# Altium footprint library connectors.PcbLib: 256 footprints (part 10 of 16)
Each footprint in its own frame and in the unit in brackets; x right, y up, seen from the top. Pads: shape width x height; smd on the part's side, far side on the other; paste and mask are expansions set on the pad; w line width, h text height; cw(c..) or ccw(c..) is an arc to the next point about the centre after c.
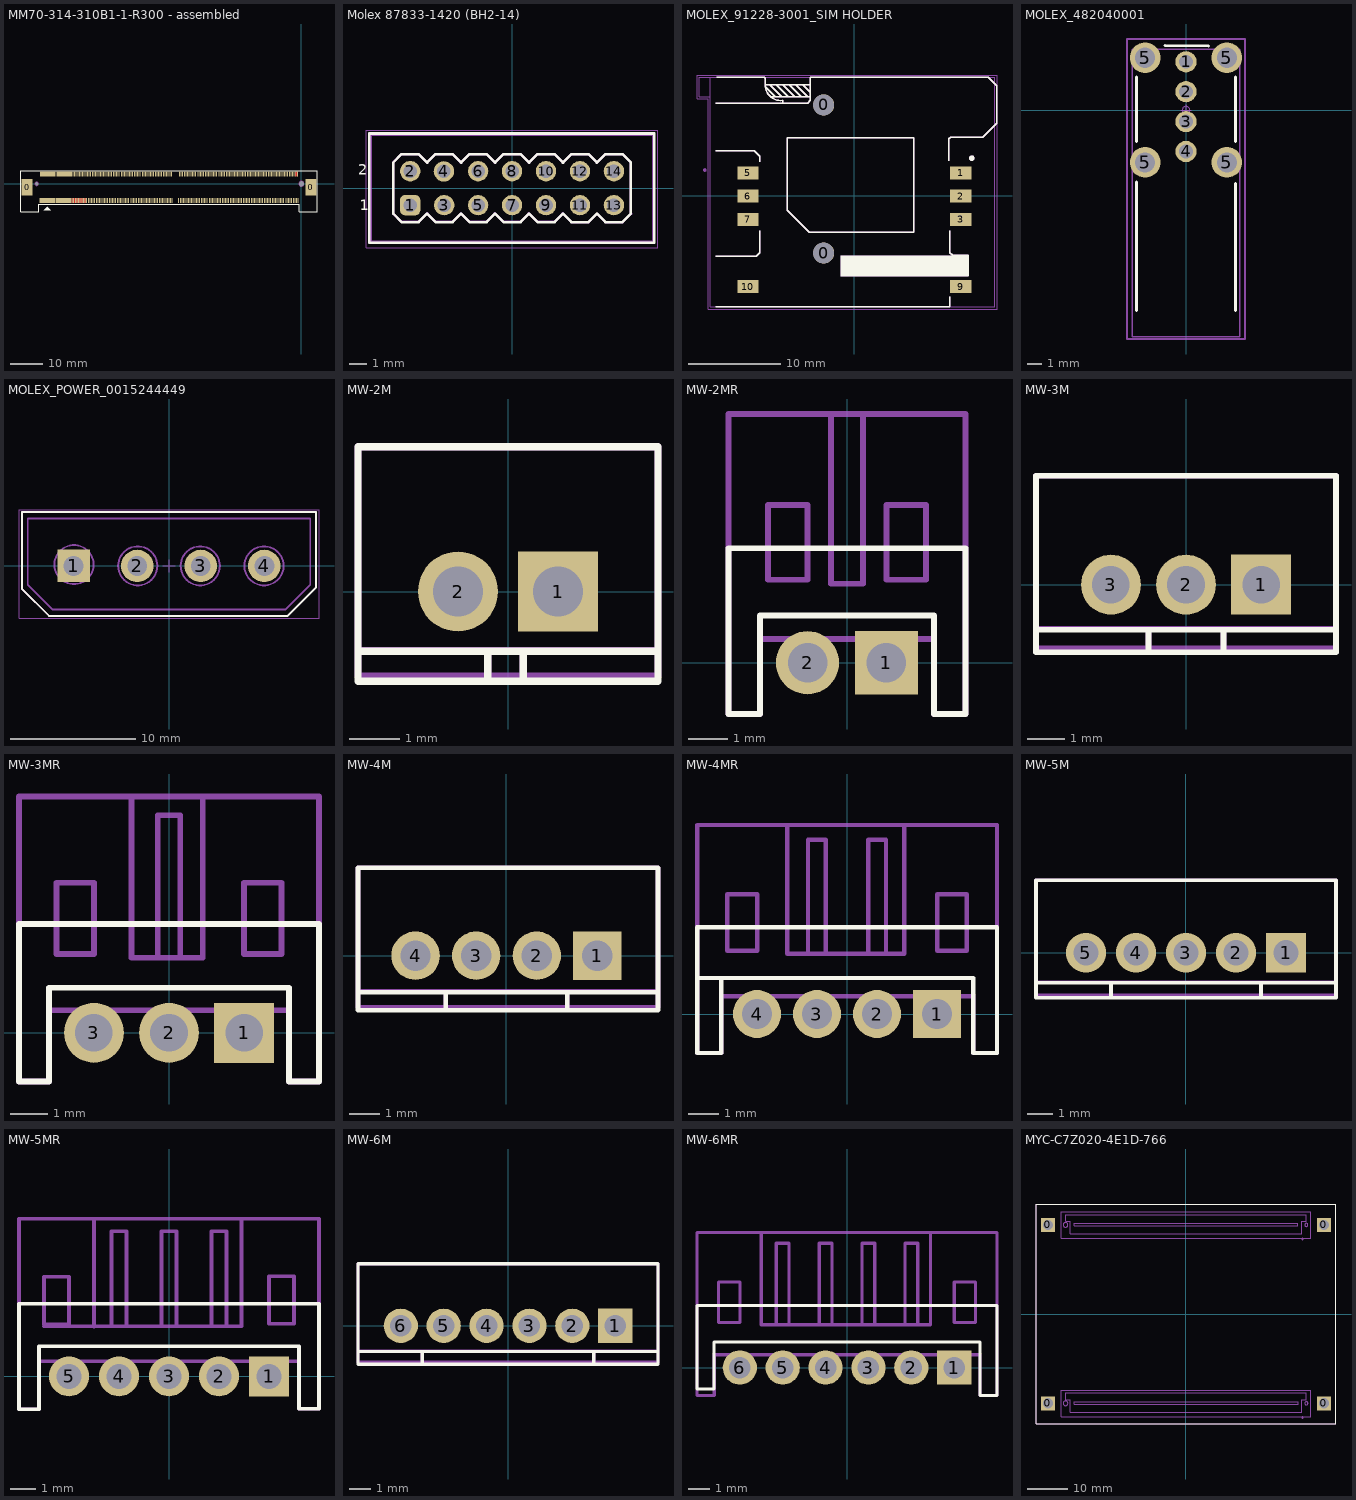
[diagram p9: the footprints below, top view; thin cyan lines are the x and y axes]

## MM70-314-310B1-1-R300 - assembled [mm]
pads (282):
  rect 3.3x5 smd: 0(-84.95,-1.1) 0(2.95,-1.1)
  round 0 hole 1.1 unplated: 0(-82,0)
  round 0 hole 1.6 unplated: 0(0,0)
  rect 0.3x1.5 smd: 1(-71,-5.2) 2(-70.75,3) 3(-70.5,-5.2) 4(-70.25,3) 5(-70,-5.2) 6(-69.75,3) 7(-69.5,-5.2) 8(-69.25,3) 9(-69,-5.2) 10(-68.75,3) 11(-68.5,-5.2) 12(-68.25,3) 13(-68,-5.2) 14(-67.75,3) 15(-67.5,-5.2) 16(-67.25,3) 17(-67,-5.2) 18(-66.75,3) 19(-66.5,-5.2) 20(-66.25,3) 21(-66,-5.2) 22(-65.75,3) 23(-65.5,-5.2) 24(-65.25,3) 25(-65,-5.2) 26(-64.75,3) 27(-64.5,-5.2) 28(-64.25,3) 29(-64,-5.2) 30(-63.75,3) 31(-63.5,-5.2) 32(-63.25,3) 33(-63,-5.2) 34(-62.75,3) 35(-62.5,-5.2) 36(-62.25,3) 37(-62,-5.2) 38(-61.75,3) 39(-61.5,-5.2) 40(-61.25,3) 41(-61,-5.2) 42(-60.75,3) 43(-60.5,-5.2) 44(-60.25,3) 45(-60,-5.2) 46(-59.75,3) 47(-59.5,-5.2) 48(-59.25,3) 49(-59,-5.2) 50(-58.75,3) 51(-58.5,-5.2) 52(-58.25,3) 53(-58,-5.2) 54(-57.75,3) 55(-57.5,-5.2) 56(-57.25,3) 57(-57,-5.2) 58(-56.75,3) 59(-56.5,-5.2) 60(-56.25,3) 61(-56,-5.2) 62(-55.75,3) 63(-55.5,-5.2) 64(-55.25,3) 65(-55,-5.2) 66(-54.75,3) 67(-54.5,-5.2) 68(-54.25,3) 69(-54,-5.2) 70(-53.75,3) 71(-53.5,-5.2) 72(-53.25,3) 73(-53,-5.2) 74(-52.75,3) 75(-52.5,-5.2) 76(-52.25,3) 77(-52,-5.2) 78(-51.75,3) 79(-51.5,-5.2) 80(-51.25,3) 81(-51,-5.2) 82(-50.75,3) 83(-50.5,-5.2) 84(-50.25,3) 85(-50,-5.2) 86(-49.75,3) 87(-49.5,-5.2) 88(-49.25,3) 89(-49,-5.2) 90(-48.75,3) 91(-48.5,-5.2) 92(-48.25,3) 93(-48,-5.2) 94(-47.75,3) 95(-47.5,-5.2) 96(-47.25,3) 97(-47,-5.2) 98(-46.75,3) 99(-46.5,-5.2) 100(-46.25,3) 101(-46,-5.2) 102(-45.75,3) 103(-45.5,-5.2) 104(-45.25,3) 105(-45,-5.2) 106(-44.75,3) 107(-44.5,-5.2) 108(-44.25,3) 109(-44,-5.2) 110(-43.75,3) 111(-43.5,-5.2) 112(-43.25,3) 113(-43,-5.2) 114(-42.75,3) 115(-42.5,-5.2) 116(-42.25,3) 117(-42,-5.2) 118(-41.75,3) 119(-41.5,-5.2) 120(-41.25,3) 121(-41,-5.2) 122(-40.75,3) 123(-40.5,-5.2) 124(-40.25,3) 125(-40,-5.2) 133(-38,-5.2) 134(-37.75,3) 135(-37.5,-5.2) 136(-37.25,3) 137(-37,-5.2) 138(-36.75,3) 139(-36.5,-5.2) 140(-36.25,3) 141(-36,-5.2) 142(-35.75,3) 143(-35.5,-5.2) 144(-35.25,3) 145(-35,-5.2) 146(-34.75,3) 147(-34.5,-5.2) 148(-34.25,3) 149(-34,-5.2) 150(-33.75,3) 151(-33.5,-5.2) 152(-33.25,3) 153(-33,-5.2) 154(-32.75,3) 155(-32.5,-5.2) 156(-32.25,3) 157(-32,-5.2) 158(-31.75,3) 159(-31.5,-5.2) 160(-31.25,3) 161(-31,-5.2) 162(-30.75,3) 163(-30.5,-5.2) 164(-30.25,3) 165(-30,-5.2) 166(-29.75,3) 167(-29.5,-5.2) 168(-29.25,3) 169(-29,-5.2) 170(-28.75,3) 171(-28.5,-5.2) 172(-28.25,3) 173(-28,-5.2) 174(-27.75,3) 175(-27.5,-5.2) 176(-27.25,3) 177(-27,-5.2) 178(-26.75,3) 179(-26.5,-5.2) 180(-26.25,3) 181(-26,-5.2) 182(-25.75,3) 183(-25.5,-5.2) 184(-25.25,3) 185(-25,-5.2) 186(-24.75,3) 187(-24.5,-5.2) 188(-24.25,3) 189(-24,-5.2) 190(-23.75,3) 191(-23.5,-5.2) 192(-23.25,3) 193(-23,-5.2) 194(-22.75,3) 195(-22.5,-5.2) 196(-22.25,3) 197(-22,-5.2) 198(-21.75,3) 199(-21.5,-5.2) 200(-21.25,3) 201(-21,-5.2) 202(-20.75,3) 203(-20.5,-5.2) 204(-20.25,3) 205(-20,-5.2) 206(-19.75,3) 207(-19.5,-5.2) 208(-19.25,3) 209(-19,-5.2) 210(-18.75,3) 211(-18.5,-5.2) 212(-18.25,3) 213(-18,-5.2) 214(-17.75,3) 215(-17.5,-5.2) 216(-17.25,3) 217(-17,-5.2) 218(-16.75,3) 219(-16.5,-5.2) 220(-16.25,3) 221(-16,-5.2) 222(-15.75,3) 223(-15.5,-5.2) 224(-15.25,3) 225(-15,-5.2) 226(-14.75,3) 227(-14.5,-5.2) 228(-14.25,3) 229(-14,-5.2) 230(-13.75,3) 231(-13.5,-5.2) 232(-13.25,3) 233(-13,-5.2) 234(-12.75,3) 235(-12.5,-5.2) 236(-12.25,3) 237(-12,-5.2) 238(-11.75,3) 239(-11.5,-5.2) 240(-11.25,3) 241(-11,-5.2) 242(-10.75,3) 243(-10.5,-5.2) 244(-10.25,3) 245(-10,-5.2) 246(-9.75,3) 247(-9.5,-5.2) 248(-9.25,3) 249(-9,-5.2) 250(-8.75,3) 251(-8.5,-5.2) 252(-8.25,3) 253(-8,-5.2) 254(-7.75,3) 255(-7.5,-5.2) 256(-7.25,3) 257(-7,-5.2) 258(-6.75,3) 259(-6.5,-5.2) 260(-6.25,3) 261(-6,-5.2) 262(-5.75,3) 263(-5.5,-5.2) 264(-5.25,3) 265(-5,-5.2) 266(-4.75,3) 267(-4.5,-5.2) 268(-4.25,3) 269(-4,-5.2) 270(-3.75,3) 271(-3.5,-5.2) 272(-3.25,3) 273(-3,-5.2) 274(-2.75,3) 275(-2.5,-5.2) 276(-2.25,3) 277(-2,-5.2) 278(-1.75,3) 279(-1.5,-5.2) 280(-1.25,3) 281(-1,-5.2)
  rect 4.8x1.5 smd: E1(-78.75,-5.2) E2(-78.5,3) E3(-73.75,-5.2) E4(-73.5,3)
Top Layer:
  region: -71.15,-4.45 -68.85,-4.45 -68.85,-5.95 -71.15,-5.95
  region: -68.65,-4.45 -66.85,-4.45 -66.85,-5.95 -68.65,-5.95
  region: -1.9,3.75 -1.1,3.75 -1.1,2.25 -1.9,2.25
Top Overlay:
  region: -78.7,-7.1 -79.8,-8.2 -77.6,-8.2
  lines w0.15: -86.9,-8.65 -86.9,4 4.9,4 4.9,-8.65 -0.6,-8.65 -0.6,-6.3 -81.4,-6.3 -81.4,-8.65 -86.9,-8.65
Keep-Out Layer:
  circle w0.15: c-82,0 r0.55
  circle w0.15: c0,0 r0.8
3D body "MM70(2).STEP": height 6.8, standoff -0.9, extent -94.65,-166.05 8.35,3.7

## Molex 87833-1420 (BH2-14) [mm] "Molex 87833-1420"
height 6.4
pads (14):
  rrect50% 1.2x1.2 hole 0.8: 1(-6,-1)
  round 1.2 hole 0.8: 2(-6,1) 3(-4,-1) 4(-4.014,0.986) 5(-2,-1) 6(-2,1) 7(0,-1) 8(0,1) 9(2,-1) 10(2,1) 11(4,-1) 12(4,1) 13(6,-1) 14(6,1)
Top Overlay:
  lines w0.15: -7,1.5 -6.5,2 -5.5,2 -5,1.5 -4.5,2 -3.5,2 -3,1.5 ; -7,1.5 -7,1.5 ; -7,1.5 -7,-1.5 -6.5,-2 -5.5,-2 -5,-1.5 ; -5,-1.5 -4.5,-2 -3.5,-2 -3,-1.5 ; -5,-1.5 -5,-1.5 ; -3,-1.5 -2.5,-2 -1.5,-2 -1,-1.5 ; -3,-1.5 -3,-1.5 ; -3,1.5 -3,1.5 ; -3,1.5 -2.5,2 -1.5,2 -1,1.5 -0.5,2 0.5,2 1,1.5 1.5,2 2.5,2 3,1.5 ; -1,-1.5 -0.5,-2 0.5,-2 1,-1.5 1.5,-2 2.5,-2 3,-1.5 3.5,-2 4.5,-2 5,-1.5 5.5,-2 6.5,-2 7,-1.5 7,1.5 6.5,2 5.5,2 5,1.5 4.5,2 3.5,2 3,1.5 ; -1,-1.5 -1,-1.5 ; 3,1.5 3,1.5 ; -8.425,-3.225 8.375,-3.225 8.375,3.219 -8.425,3.219 -8.425,-3.225
  text "2" at -9.075,0.8 h0.63
  text "1" at -8.975,-1.3 h0.63
TopAssy 13:
  drawing of 165 lines, arcs and shapes, not listed
TopCourt 15:
  lines w0.05: -8.6,-3.5 8.596,-3.5 8.596,3.4 -8.6,3.4 -8.6,-3.5
3D body "878311420.stp": height 6.41, standoff -2.49, extent -8.339,-3.164 8.311,3.136

## MOLEX_91228-3001_SIM HOLDER [mm] "91228-3001 / 91236-0001_SIM HOLDER MOLEX"
pads (10):
  round 2.3 hole 2.3 unplated: 0(-3.34,-6.24) 0(-3.34,9.9)
  rect 2.3x1.4 smd: 1(11.6,2.5) 2(11.6,-0.04) 3(11.6,-2.58) 5(-11.6,2.5) 6(-11.6,-0.04) 7(-11.6,-2.58) 9(11.6,-9.9) 10(-11.6,-9.9)
Top Overlay:
  circle w0.3: c12.8,4.1 r0.15
  rectangle: -1.5,-8.8 12.4,-6.5
  lines w0.15: -15.1,-12.1 10.4,-12.1 10.4,-11 ; -15.1,-6.6 -10.7,-6.6 -10.3,-6.2 -10.3,-3.8 ; -15.1,4.9 -10.9,4.9 -10.3,4.3 -10.3,3.7 ; -15.1,10.1 -5.1,10.1 -4.8,10.4 -4.8,12.9 14.6,12.9 15.5,12 15.5,7.9 14,6.4 10.5,6.4 10.3,6.2 10.3,3.8 ; -15,12.9 -9.829,12.9 -9.714,12.786 -9.714,12.302 ccw(c-8,12.1) -7.798,10.386 -7.798,10.102 ; -9.7,11.9 -8.6,10.8 ; -9.7,12.1 -4.8,12.1 ; -9.2,12.1 -7.9,10.8 ; -9.1,10.8 -4.8,10.8 -4.8,11.3 -5.6,12.1 ; -8.5,12.1 -7.2,10.8 ; -7.8,12.1 -6.5,10.8 ; -7.1,12.1 -5.8,10.8 ; -6.4,12.1 -5.1,10.8 ; 10.4,-8.7 12.4,-8.7 12.4,-6.5 10.7,-6.5 10.4,-6.2 10.4,-3.8 ; -7.3,-1.6 -7.3,6.3 6.5,6.3 6.5,-4 -4.9,-4 -7.3,-1.6
TopAssy 13:
  circle w0.3: c12.8,4.1 r0.15
  circle w0.2: c-16.3,2.8 r0.1
  circle w0.2: c-16.3,2.8 r0.1
  rectangle: -1.5,-8.8 12.4,-6.5
  lines w0.127: -16.9,10.8 -16.9,12.9 ; -16.9,10.8 -15.7,10.8 ; -16.9,10.8 -16.9,12.9 ; -16.9,10.8 -15.7,10.8 ; -16.9,12.9 -15.7,12.9 ; -16.9,12.9 -15.7,12.9 ; -15.7,-12.1 -15.7,10.8 ; -15.7,-12.1 15.3,-12.1 ; -15.7,-12.1 -15.7,10.8 ; -15.7,-12.1 15.3,-12.1 ; -15.7,10.8 -15.7,12.9 ; -15.7,10.8 -15.7,12.9 ; -15.7,12.9 15.3,12.9 ; -15.7,12.9 15.3,12.9 ; 15.3,-12.1 15.3,12.9 ; 15.3,-12.1 15.3,12.9
  lines w0.15: -15.1,-12.1 10.4,-12.1 10.4,-11 ; -15.1,-6.6 -10.7,-6.6 -10.3,-6.2 -10.3,-3.8 ; -15.1,4.9 -10.9,4.9 -10.3,4.3 -10.3,3.7 ; -15.1,10.1 -5.1,10.1 -4.8,10.4 -4.8,12.9 14.6,12.9 15.5,12 15.5,7.9 14,6.4 10.5,6.4 10.3,6.2 10.3,3.8 ; -15,12.9 -9.829,12.9 -9.714,12.786 -9.714,12.302 ccw(c-8,12.1) -7.798,10.386 -7.798,10.102 ; -9.7,11.9 -8.6,10.8 ; -9.7,12.1 -4.8,12.1 ; -9.2,12.1 -7.9,10.8 ; -9.1,10.8 -4.8,10.8 -4.8,11.3 -5.6,12.1 ; -8.5,12.1 -7.2,10.8 ; -7.8,12.1 -6.5,10.8 ; -7.1,12.1 -5.8,10.8 ; -6.4,12.1 -5.1,10.8 ; 10.4,-8.7 12.4,-8.7 12.4,-6.5 10.7,-6.5 10.4,-6.2 10.4,-3.8 ; -7.3,-1.6 -4.9,-4 6.5,-4 6.5,6.3 -7.3,6.3 -7.3,-1.6
TopCourt 15:
  lines w0.05: -17.15,10.55 -15.95,10.55 -15.95,-12.35 15.55,-12.35 15.55,13.15 -17.15,13.15 -17.15,10.55
3D body "91228-3001--3DModel-STEP-56544.STEP": height 3.1, standoff 0, extent -16.9,-12.1 15.3,12.9

## MOLEX_482040001 [mm]
pads (8):
  round 1.42 hole 0.92: 1(0,3.23) 2(0,1.23) 3(0,-0.77) 4(0,-2.77)
  round 2.05 hole 1.35: 5(-2.735,-3.5) 5(-2.735,3.5) 5(2.735,-3.5) 5(2.735,3.5)
Top Overlay:
  lines w0.2: -3.3,-13.4 -3.3,-4.8 ; -3.3,-2.1 -3.3,2.2 ; -1.4,4.33 1.5,4.3 ; 3.3,-13.4 3.3,-4.9 ; 3.3,-2.1 3.3,2.2
Mechanical 12:
  circle w0.025: c0,-2.77 r0.46
  circle w0.025: c0,-0.77 r0.46
  circle w0.025: c0,1.23 r0.46
  circle w0.025: c0,3.23 r0.46
  circle w0.025: c-2.735,-3.5 r0.675
  circle w0.025: c-2.735,3.5 r0.675
  circle w0.025: c2.735,3.5 r0.675
  circle w0.025: c2.735,-3.5 r0.675
  lines w0.025: -3.61,-15.168 3.59,-15.168 3.59,4.082 -3.61,4.082 -3.61,-15.168
TopAssy 13:
  lines w0.1: -3.61,-15.168 3.59,-15.168 3.59,4.082 -3.61,4.082 -3.61,-15.168
TopCourt 15:
  circle w0.05: c0,0 r0.25
  lines w0.05: -0.35,0 0.35,0 ; 0,-0.35 0,0.35
  lines w0.12: -3.937,-15.312 3.937,-15.312 3.937,4.754 -3.937,4.754 -3.937,-15.312
3D body "48204-0001.stp": height 14.59, standoff -3.7, extent -3.61,-15.168 3.59,4.082

## MOLEX_POWER_0015244449 [mm] "Разъем на плату, шаг 5.08, вилка MOLEX_POWER_0015244449"
height 12
pads (4):
  rect 2.6x2.6 hole 1.6: 1(-7.62,0)
  round 2.6 hole 1.6: 2(-2.54,0) 3(2.54,0) 4(7.62,0)
Top Overlay:
  lines w0.15: -11.745,-1.855 -9.6,-4 9.5,-4 11.755,-1.745 11.755,4.3 -11.745,4.3 -11.745,-1.855
TopAssy 13:
  circle w0.15: c7.6,0 r1.565
  circle w0.15: c2.5,0 r1.565
  circle w0.15: c-2.5,0 r1.565
  circle w0.15: c-7.6,0.1 r1.565
  lines w0.15: -11.745,-1.855 -11.745,4.3 11.755,4.3 11.755,-1.745 9.5,-4 -9.6,-4 -11.745,-1.855 ; -11.3,-1.5 -9.3,-3.5 9.3,-3.5 11.3,-1.5 11.3,3.8 -11.3,3.8 -11.3,-1.5
TopCourt 15:
  lines w0.05: -0.5,0 0.5,0 ; 0,-0.5 0,0.5 ; -12,-4.2 12,-4.2 12,4.5 -12,4.5 -12,-4.2
3D body "015244449.stp": height 10.26, standoff -3.5, extent -11.6,-4.04 11.66,4.24

## MW-2M [mm] "MW-2M (B2B-PH-K) (WB-2) (200G1-V02) шаг 2,00 mm (РН-тип) 2 мм вилка на плату прямая"
height 11.4
pads (2):
  rect 1.6x1.6 hole 1: 1(1,0)
  round 1.6 hole 1: 2(-1,0)
Top Overlay:
  lines w0.15: -3,-1.2 3,-1.199 ; -0.4,-1.8 -0.4,-1.2 ; 0.3,-1.8 0.3,-1.2 ; -3,-1.8 3,-1.8 3,2.9 -3,2.9 -3,-1.8
  text "." at 3,-2.2 h1.52
TopAssy 13:
  lines w0.15: -3,-1.182 3,-1.182 ; -0.4,-1.7 -0.4,-1.182 ; 0.3,-1.682 0.3,-1.182 ; -3,-1.7 3,-1.7 3,2.9 -3,2.9 -3,-1.7
3D body "B2B-PH-K-S.STEP": height 6, standoff -3.4, extent -2.95,-1.7 2.95,2.8

## MW-2MR [mm] "MW-2MR (S2B-PH-K) (WB-2R)(200G1-R02) шаг 2,00 mm (РН-тип) 2 мм вилка на плату угловая"
height 11.4
pads (2):
  rect 1.6x1.6 hole 1: 1(1,0)
  round 1.6 hole 1: 2(-1,0)
Top Overlay:
  lines w0.15: -3,-1.3 -2.2,-1.3 -2.2,1.2 2.2,1.2 2.2,-1.3 3,-1.3 3,2.9 -3,2.9 -3,-1.3
  text "." at 1.7,-1.5 h1.52
TopAssy 13:
  lines w0.15: -2.2,0.6 2.2,0.6 ; -2.2,0.618 -2.2,-1.3 -3,-1.3 -3,6.3 3,6.3 3,-1.3 2.2,-1.3 2.2,0.618 ; -0.4,6.3 -0.4,2 0.4,2 0.4,6.3 ; -2,2.1 -2,4 -1,4 -1,2.1 -2,2.1 ; 1,2.1 1,4 2,4 2,2.1 1,2.1
3D body "S2B-PH-K-S.STEP": height 4.85, standoff -3.35, extent -2.9,-1.3 3,6.3

## MW-3M [mm] "MW-3M (B3B-PH-K) (WB-3) (200G1-V03) шаг 2,00 mm (РН-тип) 2 мм вилка на плату прямая"
height 11.4
pads (3):
  rect 1.6x1.6 hole 1: 1(2,0)
  round 1.6 hole 1: 2(0,0) 3(-2,0)
Top Overlay:
  lines w0.15: -4,-1.2 4,-1.199 ; -1,-1.8 -1,-1.2 ; 1,-1.8 1,-1.2 ; -4,-1.8 -4,2.9 4,2.9 4,-1.8 -4,-1.8
  text "." at 4,-2.2 h1.52
TopAssy 13:
  lines w0.15: -4,-1.182 4,-1.182 ; -1,-1.7 -1,-1.2 ; 1,-1.682 1,-1.182 ; -4,-1.7 -4,2.9 4,2.9 4,-1.7 -4,-1.7
3D body "B3B-PH-K-S.STEP": height 6, standoff -3.4, extent -3.95,-1.7 3.95,2.8

## MW-3MR [mm] "MW-3MR (S3B-PH-K) (WB-3R)(200G1-R03) шаг 2,00 mm (РН-тип) 2 мм вилка на плату угловая"
height 11.4
pads (3):
  rect 1.6x1.6 hole 1: 1(2,0)
  round 1.6 hole 1: 2(0,0) 3(-2,0)
Top Overlay:
  lines w0.15: -4,-1.3 -4,2.9 4,2.9 4,-1.3 3.2,-1.3 3.2,1.2 -3.2,1.2 -3.2,-1.3 -4,-1.3
  text "." at 2.4,-1.6 h1.52
TopAssy 13:
  lines w0.15: -3.2,0.6 3.2,0.6 ; -3.2,0.618 -3.2,-1.3 -4,-1.3 -4,6.3 4,6.3 4,-1.3 3.2,-1.3 3.2,0.618 ; -1,6.3 -1,2 0.9,2 0.9,6.3 ; -0.3,2 -0.3,5.8 0.3,5.8 0.3,2 ; -3,2.1 -2,2.1 -2,4 -3,4 -3,2.1 ; 2,2.1 3,2.1 3,4 2,4 2,2.1
3D body "S3B-PH-K-S.STEP": height 4.85, standoff -3.35, extent -3.925,-1.35 3.975,6.25

## MW-4M [mm] "MW-4M (B4B-PH-K) (WB-4) (200G1-V04) шаг 2,00 mm (РН-тип) 2 мм вилка на плату прямая"
height 11.4
pads (4):
  rect 1.6x1.6 hole 1: 1(3,0)
  round 1.6 hole 1: 2(1,0) 3(-1,0) 4(-3,0)
Top Overlay:
  lines w0.15: -4.9,-1.2 5,-1.199 ; -2,-1.8 -2,-1.2 ; 2,-1.8 2,-1.2 ; -4.9,-1.8 5,-1.8 5,2.9 -4.9,2.9 -4.9,-1.8
  text "." at 5,-2.2 h1.52
TopAssy 13:
  lines w0.15: -4.9,-1.182 5,-1.182 ; -2,-1.7 -2,-1.182 ; 2,-1.682 2,-1.182 ; -4.9,-1.7 5,-1.7 5,2.9 -4.9,2.9 -4.9,-1.7
3D body "B4B-PH-K-S.STEP": height 6.1, standoff -3.3, extent -4.95,-1.7 4.95,2.8

## MW-4MR [mm] "MW-4MR (S4B-PH-K) (WB-4R)(200G1-R04) шаг 2,00 mm (РН-тип) 2 мм вилка на плату угловая"
height 11.4
pads (4):
  rect 1.6x1.6 hole 1: 1(3,0)
  round 1.6 hole 1: 2(1,0) 3(-1,0) 4(-3,0)
Top Overlay:
  lines w0.15: -5,1.2 4.2,1.2 4.2,-1.3 5,-1.3 5,2.9 -5,2.9 -5,-1.3 -4.2,-1.3 -4.2,1.2
  text "." at 3.4,-1.5 h1.52
TopAssy 13:
  lines w0.15: -4.2,0.6 4.2,0.6 ; -4.2,0.618 -4.2,-1.3 -5,-1.3 -5,6.3 5,6.3 5,-1.3 4.2,-1.3 4.2,0.618 ; -2,6.3 -2,2 1.9,2 1.9,6.3 ; -1.3,2 -1.3,5.8 -0.7,5.8 -0.7,2 ; 0.7,2 0.7,5.8 1.3,5.8 1.3,2 ; -4,2.1 -4,4 -3,4 -3,2.1 -4,2.1 ; 3,2.1 3,4 4,4 4,2.1 3,2.1
3D body "S4B-PH-K-S.STEP": height 4.85, standoff -3.35, extent -4.925,-1.35 4.975,6.25

## MW-5M [mm] "MW-5M (B5B-PH-K) (WB-5) (200G1-V05) шаг 2,00 mm (РН-тип) 2 мм вилка на плату прямая"
height 11.4
pads (5):
  rect 1.6x1.6 hole 1: 1(4,0)
  round 1.6 hole 1: 2(2,0) 3(0,0) 4(-2,0) 5(-4,0)
Top Overlay:
  lines w0.15: -6,-1.201 6,-1.199 ; -3,-1.8 -3,-1.2 ; 3,-1.8 3,-1.2 ; -6,-1.8 -6,2.9 6,2.9 6,-1.8 -6,-1.8
  text "." at 6,-2.2 h1.52
TopAssy 13:
  lines w0.15: -6,-1.182 6,-1.182 ; -3,-1.7 -3,-1.182 ; 3,-1.682 3,-1.182 ; -6,-1.7 -6,2.9 6,2.9 6,-1.7 -6,-1.7
3D body "B5B-PH-K-S.STEP": height 6.1, standoff -3.3, extent -5.95,-1.7 5.95,2.8

## MW-5MR [mm] "MW-5MR (S5B-PH-K) (WB-5R)(200G1-R05) шаг 2,00 mm (РН-тип) 2 мм вилка на плату угловая"
height 11.4
pads (5):
  rect 1.6x1.6 hole 1: 1(4,0)
  round 1.6 hole 1: 2(2,0) 3(0,0) 4(-2,0) 5(-4,0)
Top Overlay:
  lines w0.15: -6,2.882 -6,-1.318 -5.2,-1.318 -5.2,1.182 ; -6,2.9 6,2.9 6,-1.3 5.2,-1.3 5.2,1.2 -5.2,1.2
  text "." at 6,-2.2 h1.52
TopAssy 13:
  lines w0.15: -6,6.282 -6,-1.318 -5.2,-1.318 -5.2,0.6 5.2,0.6 ; -6,6.3 6,6.3 6,-1.3 5.2,-1.3 5.2,0.618 ; -5,2 2.9,2 2.9,6.3 ; -3,1.982 -3,6.282 ; -2.3,2 -2.3,5.8 -1.7,5.8 -1.7,2 ; -0.3,2 -0.3,5.8 0.3,5.8 0.3,2 ; 1.7,2 1.7,5.8 2.3,5.8 2.3,2 ; -5,2.082 -4,2.082 -4,3.982 -5,3.982 -5,2.082 ; 4,2.1 5,2.1 5,4 4,4 4,2.1
3D body "S5B-PH-K-S.STEP": height 4.85, standoff -3.35, extent -5.9,-1.3 6,6.3

## MW-6M [mm] "MW-6M (B6B-PH-K) (WB-6) (200G1-V06) шаг 2,00 mm (РН-тип) 2 мм вилка на плату прямая"
height 11.4
pads (6):
  rect 1.6x1.6 hole 1: 1(5,0)
  round 1.6 hole 1: 2(3,0) 3(1,0) 4(-1,0) 5(-3,0) 6(-5,0)
Top Overlay:
  lines w0.15: -7,-1.201 7,-1.199 ; -4,-1.8 -4,-1.2 ; 4,-1.8 4,-1.2 ; -7,-1.8 -7,2.9 7,2.9 7,-1.8 -7,-1.8
  text "." at 7,-2.2 h1.52
TopAssy 13:
  lines w0.15: -7,-1.182 7,-1.182 ; -4,-1.7 -4,-1.182 ; 4,-1.682 4,-1.182 ; -7,-1.7 -7,2.9 7,2.9 7,-1.7 -7,-1.7
3D body "B6B-PH-K-S.STEP": height 6.1, standoff -3.3, extent -6.95,-1.7 6.95,2.8

## MW-6MR [mm] "MW-6MR (S6B-PH-K) (WB-6R)(200G1-R06) шаг 2,00 mm (РН-тип) 2 мм вилка на плату угловая"
height 11.4
pads (6):
  rect 1.6x1.6 hole 1: 1(5,0)
  round 1.6 hole 1: 2(3,0) 3(1,0) 4(-1,0) 5(-3,0) 6(-5,0)
Top Overlay:
  lines w0.15: -7,-1 -7,2.9 7,2.9 7,-1.3 6.2,-1.3 6.2,1.2 -6.2,1.2 -6.2,-1 -7,-1
  text "." at 7,-2.2 h1.52
TopAssy 13:
  lines w0.15: -6.2,0.6 6.2,0.6 ; -6.2,0.618 -6.2,-1.3 -7,-1.3 -7,6.3 7,6.3 7,-1.3 6.2,-1.3 6.2,0.618 ; -4,6.3 -4,2 3.9,2 3.9,6.3 ; -3.3,2 -3.3,5.8 -2.7,5.8 -2.7,2 ; -1.3,2 -1.3,5.8 -0.7,5.8 -0.7,2 ; 0.7,2 0.7,5.8 1.3,5.8 1.3,2 ; 2.7,2 2.7,5.8 3.3,5.8 3.3,2 ; -6,2.1 -5,2.1 -5,4 -6,4 -6,2.1 ; 5,2.1 6,2.1 6,4 5,4 5,2.1
3D body "S6B-PH-K-S.STEP": height 4.85, standoff -3.35, extent -6.925,-1.35 6.975,6.25

## MYC-C7Z020-4E1D-766 [mm] "Myir SoM"
pads (4):
  rect 3.5x3.5 hole 2.54: 0(-34.5,-22.3) 0(-34.5,22.3) 0(34.5,-22.3) 0(34.5,22.3)
Top Overlay:
  lines w0.15: -37.5,-27.445 -37.5,27.5 37.5,27.5 37.5,-27.445 -37.5,-27.445
TopAssy 13:
  circle w0.3: c29.14,-25.843 r0.15
  circle w0.3: c29.14,18.757 r0.15
  circle w0.2: c-30.1,-22.3 r0.6
  circle w0.2: c-30.1,22.3 r0.6
  circle w0.2: c30.1,-22.3 r0.4
  circle w0.2: c30.1,22.3 r0.4
  lines w0.15: -37.5,-27.445 -37.5,27.5 37.5,27.5 37.5,-27.445 -37.5,-27.445
  lines w0.2: -31.2,-25.6 -31.2,-19 31.2,-19 31.2,-25.6 -31.2,-25.6 ; -31.2,19 -31.2,25.6 31.2,25.6 31.2,19 -31.2,19 ; -30.1,-21.4 -30.1,-19.7 30.1,-19.7 30.1,-21.4 29,-21.4 29,-24.5 -29,-24.5 -29,-21.4 -30.1,-21.4 ; -30.1,23.2 -30.1,24.9 30.1,24.9 30.1,23.2 29,23.2 29,20.1 -29,20.1 -29,23.2 -30.1,23.2 ; -27.9,-22.5 -27.9,-21.9 28,-21.9 28,-22.5 -27.9,-22.5 ; -27.9,22.1 -27.9,22.7 28,22.7 28,22.1 -27.9,22.1